# Altium footprint library My Library.PcbLib: 872 footprints (part 40 of 55)
Each footprint in its own frame and in the unit in brackets; x right, y up, seen from the top. Pads: shape width x height; smd on the part's side, far side on the other; paste and mask are expansions set on the pad; w line width, h text height; cw(c..) or ccw(c..) is an arc to the next point about the centre after c.
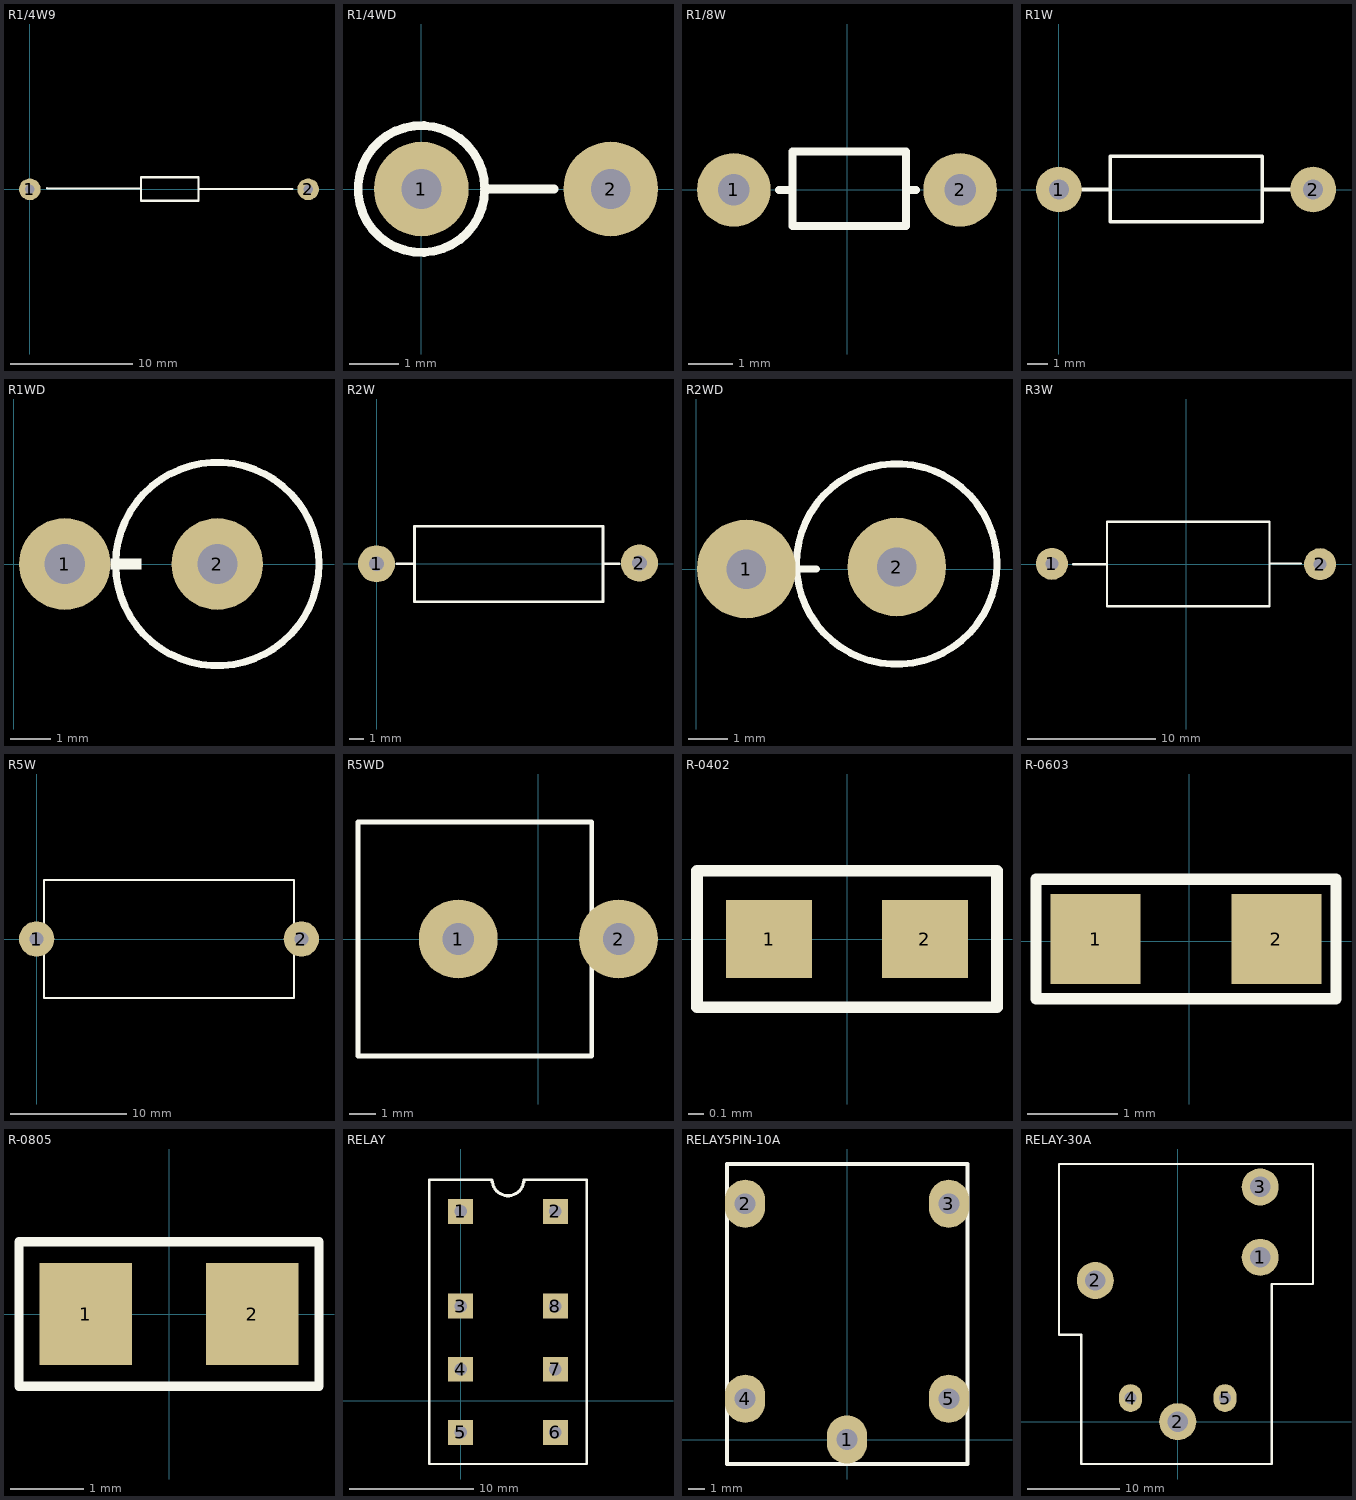
[diagram p39: the footprints below, top view; thin cyan lines are the x and y axes]

## R1/4W9 [mil] "R 1/4W, 2 Pin, 600mil"
height 100
pads (2):
  round 70 hole 31: 1(0,0) 2(900,0)
Top Overlay:
  lines w7: 56.01,3.24 360,2 ; 545,1 849,1 ; 360,-37 545,-37 545,39 360,39 360,-37

## R1/4WD [mm] "R 1/4W, 2 Pin, 150mil"
height 2.54
pads (2):
  round 1.905 hole 0.8: 1(0,0) 2(3.81,0)
Top Overlay:
  circle w0.178: c0,0 r1.276
  lines w0.178: 1.27,0 2.667,0
3D body "SW3DPS-0_5W METAL FILM RESISTOR-DEFAULT.STEP": height 13.42, standoff -4.28, extent -1.778,-1.7 4.322,1.7

## R1/8W [mil] "R 1/8W, 2 pin, 300mil"
height 100
pads (2):
  round 65 hole 28: 1(-100,0) 2(100,0)
Top Overlay:
  lines w7: -60,0 -48,0 ; 54,0 61,0 ; -48,-32 -48,34 52,34 52,-32 -48,-32
3D body "SW3dPS-Res_Normal (0.25W).STEP": height 86.31, standoff -68.11, extent -135,-35.48 135,37

## R1W [mil] "R 1W, 2 pin, 500mil"
height 100
pads (2):
  round 90 hole 39.37: 1(0,0) 2(500,0)
Top Overlay:
  lines w7: 46,0 101,0 ; 400,0 460,0 ; 101,0 101,-63 400,-63 400,65 101,65 101,0

## R1WD [mil] "R 1W, 2 pin, 500mil"
height 100
pads (2):
  round 90 hole 39.37: 1(50,0) 2(200,0)
Top Overlay:
  circle w7: c200,0 r100
  region: 125,5 125,-5 95,-5 95,5

## R2W [mm] "R2W, 2 pin, 700mil"
height 5.08
pads (2):
  round 2.5 hole 1: 1(0,0) 2(17.755,0.051)
Top Overlay:
  lines w0.178: 1.372,0 2.565,0 ; 15.316,0 16.383,0 ; 2.565,0 2.565,2.54 15.291,2.54 15.291,-2.565 2.565,-2.565 2.565,0
3D body "SW3dPS-AXIAL_RESISTOR(3W).STEP": height 8.3, standoff -2, extent -2.362,-3.327 19.838,3.273

## R2WD [mm] "R2W, 2 pin, 700mil"
height 5.08
pads (2):
  round 2.5 hole 1: 1(1.27,0) 2(5.08,0.051)
Top Overlay:
  circle w0.178: c5.08,0.127 r2.54
  lines w0.178: 2.159,0 3.048,0

## R3W [mm] "R2W, 2 pin, 700mil"
height 5.08
pads (2):
  round 2.5 hole 1: 1(-10.503,0.013) 2(10.503,-0.013)
Top Overlay:
  lines w0.178: -8.826,-0.013 -6.185,-0.013 ; 6.566,0.038 9.004,0.038 ; -6.185,-3.315 6.54,-3.315 6.54,3.315 -6.185,3.315 -6.185,0.038 -6.185,-3.315
3D body "SW3dPS-AXIAL_RESISTOR(3W).STEP": height 8.3, standoff -2, extent -11.113,-3.289 11.087,3.311

## R5W [mil] "R5W , 2 pin, 400 x 950mil"
height 400
pads (2):
  round 120 hole 47.24: 1(0,0) 2(900,0)
Top Overlay:
  lines w7: 25,-200 875,-200 875,200 25,200 25,-200
3D body "User Library-5W Resistor.STEP": height 362.6, standoff -98.43, extent -84.69,-190 954.68,191.89

## R5WD [mm] "R5W , 2 pin, 300 x 600 mil"
height 10.16
pads (2):
  round 3 hole 1.2: 1(-3.048,0) 2(3.048,0)
Top Overlay:
  lines w0.178: -6.858,-4.445 -6.858,4.445 2.032,4.445 2.032,-4.445 -6.858,-4.445
3D body "SW3dPS-5W Res.STEP": height 23.05, standoff -2.4, extent -8.648,-5.08 4.432,4.92

## R-0402 [mil]
pads (2):
  rect 22x20 smd: 1(-20,0) 2(20,0)
Top Overlay:
  lines w3: -38.5,-17.5 38.5,-17.5 38.5,17.5 -38.5,17.5 -38.5,-17.5
3D body: height 11.81, standoff 0.98, extent -20,-10 20,10
3D body: height 12.2, standoff 0, extent -21.5,-10.5 -18.5,10.5
3D body: height 12.2, standoff 0, extent 18.49,-10.51 21.49,10.49

## R-0603 [mm] "Chip Capacitor; Body 1.6 x 0.8 mm (LxW typ)"
height 0.87
pads (2):
  rect 1x1 smd: 1(-1.041,0.025) 2(0.965,0.025)
Top Overlay:
  lines w0.127: -1.702,-0.635 1.626,-0.635 1.626,0.686 -1.702,0.686 -1.702,-0.635
3D body "User Library-RESC1608X05N.STEP": height 0.45, standoff 0, extent -0.8,-0.399 0.75,0.451

## R-0805 [mil] "Compoment SMD 80x50mil"
height 50
pads (2):
  rect 50x55 smd: 1(-45,0) 2(45,0)
Top Overlay:
  lines w5: -81,-39 81,-39 81,39 -81,39 -81,-39
3D body "SW3dPS-0805 SMD Resistor.STEP": height 30.79, standoff 0, extent -39.36,-24.6 39.38,24.61

## RELAY [mm]
pads (8):
  rect 2x2 hole 1: 1(0,15.24) 2(7.62,15.24) 3(0,7.62) 4(0,2.54) 5(0,-2.54) 6(7.62,-2.54) 7(7.62,2.54) 8(7.62,7.62)
Top Overlay:
  lines w0.2: 2.413,17.78 -2.54,17.78 -2.54,-5.08 10.16,-5.08 10.16,17.78 5.08,17.78
  lines w0.254: 2.534,17.78 ccw(c3.81,17.78) 5.086,17.78
3D body "User Library-8PIN-Relay.step": height 12.3, standoff -3, extent -1.09,-4.05 8.71,16.75

## RELAY5PIN-10A [mm]
pads (5):
  oval 2.5x3 hole 1.3: 1(0,0) 2(-6.35,14.7) 3(6.35,14.7) 4(-6.35,2.54) 5(6.35,2.54)
Top Overlay:
  lines w0.254: -7.493,-1.524 7.507,-1.524 7.507,17.176 -7.493,17.176 -7.493,-1.524
3D body: height 16, standoff 0, extent -7.493,-1.524 7.493,17.145

## RELAY-30A [mm]
pads (6):
  round 4 hole 2.2: 1(8.9,17.74) 2(-8.9,15.24) 2(0,0) 3(8.9,25.34)
  oval 2.5x3 hole 1.3: 4(-5.1,2.54) 5(5.1,2.54)
Top Overlay:
  lines w0.254: -12.827,9.398 -10.414,9.398 -10.414,-4.572 10.16,-4.572 10.16,14.859 14.605,14.859 14.605,27.813 -12.827,27.813 -12.827,9.398
3D body "User Library-RELAY-RT1-24-30-A.STEP": height 20.21, standoff -2.79, extent -12.687,-4.369 14.313,27.631